# Altium integrated library Cap-Cer-SMD_V2.IntLib: 957 symbols (part 5 of 7)
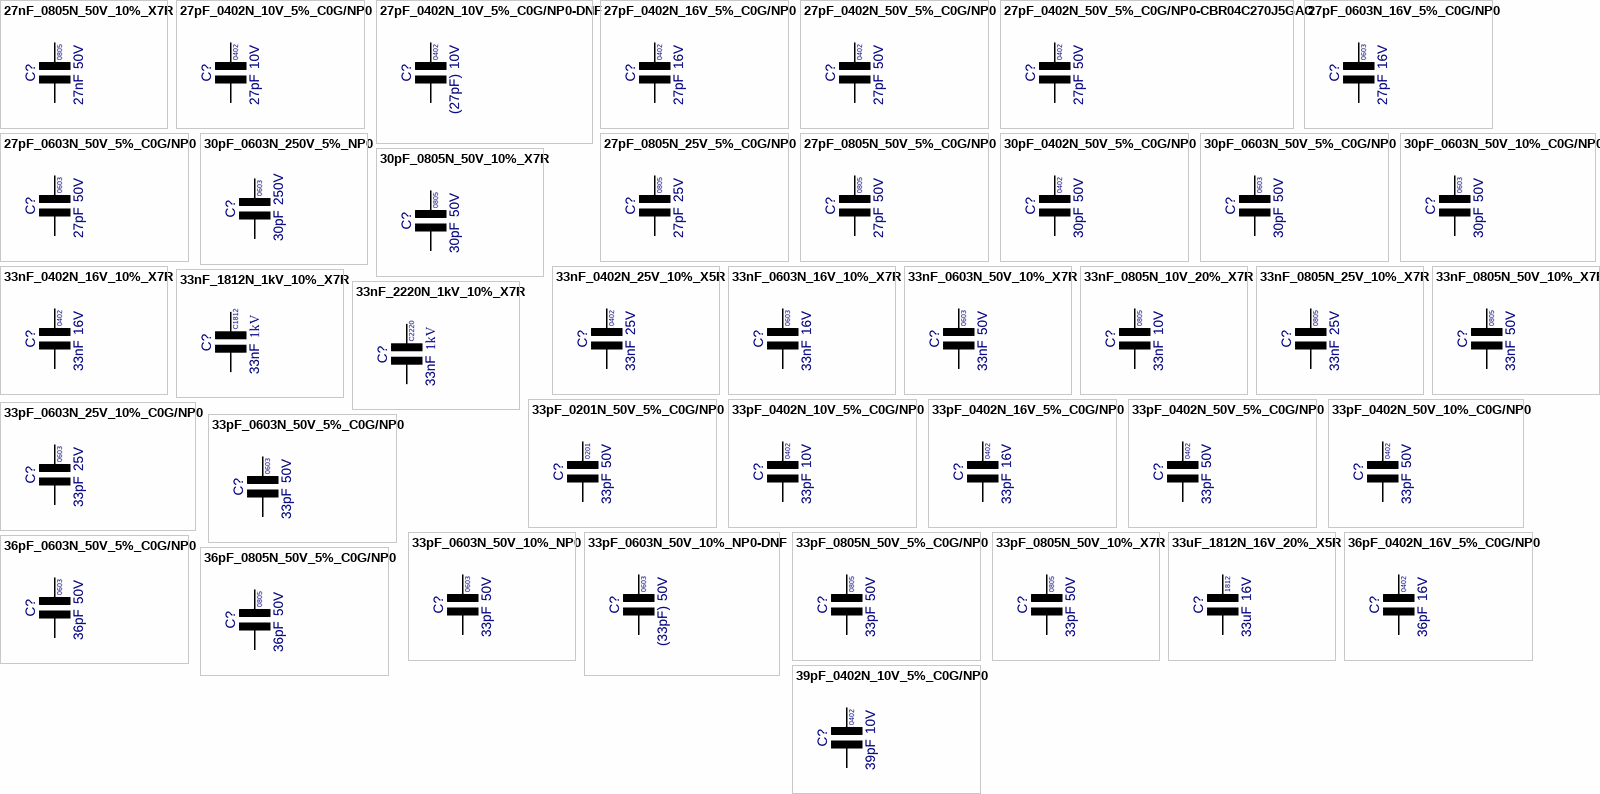
[diagram p27: symbols 27nF_0805N_50V_10%_X7R to 39pF_0402N_10V_5%_C0G/NP0]

## 33uF_1812N_16V_20%_X5R
designator C?, comment value 33uF  Voltage: 16V  Text1: 1812  (hidden comment: 33uF_C1812_16V_20%_X5R)
Cap Ceramic X5R; Manufacturer: Various; Part Number: 33uF 1812 16V 20% X5R; Tol: 20%; Package: CAPC1812X280N; EDM-PN: *; Text2: *; SAAB PN: *; DCE Part No: *
footprint CAPC1812X280N (Chip Capacitor, 1812, 2-Leads, Body 4.5x3.2mm, IPC Medium Density)
pins: 1, 2

## 36pF_0402N_16V_5%_C0G/NP0
designator C?, comment value 36pF  Voltage: 16V  Text1: 0402  (hidden comment: 36pF_C0402_16V_5%_C0G/NP0)
Cap Ceramic C0G/NP0; Manufacturer: Various; Part Number: 36pF 0402 16V 5% C0G/NP0; Tol: 5%; Package: CAPC0402X60N; EDM-PN: *; Text2: *; SAAB PN: *; DCE Part No: *
footprint CAPC0402X60N (Chip Capacitor, 0402, 2-Leads, Body 1.0x0.5mm, IPC Medium Density)
pins: 1, 2

## 36pF_0603N_50V_5%_C0G/NP0
designator C?, comment value 36pF  Voltage: 50V  Text1: 0603  (hidden comment: 36pF_C0603_50V_5%_C0G/NP0)
Cap Ceramic C0G/NP0; Manufacturer: Various; Part Number: 36pF 0603 50V 5% C0G/NP0; Tol: 5%; Package: CAPC0603X85N; EDM-PN: *; Text2: *; SAAB PN: *; DCE Part No: *
footprint CAPC0603X85N (Chip Capacitor, 0603, 2-Leads, Body 1.6x0.8mm, IPC Medium Density)
pins: 1, 2

## 36pF_0805N_50V_5%_C0G/NP0
designator C?, comment value 36pF  Voltage: 50V  Text1: 0805  (hidden comment: 36pF_C0805_50V_5%_C0G/NP0)
Cap Ceramic C0G/NP0; Manufacturer: Various; Part Number: 36pF 0805 50V 5% C0G/NP0; Tol: 5%; Package: CAPC0805X110N; EDM-PN: *; Text2: *; SAAB PN: *; DCE Part No: *
footprint CAPC0805X110N (Chip Capacitor, 0805, 2-Leads, Body 2.0x1.3mm, IPC Medium Density)
pins: 1, 2

## 39pF_0402N_10V_5%_C0G/NP0
designator C?, comment value 39pF  Voltage: 10V  Text1: 0402  (hidden comment: 39pF_C0402_10V_5%_C0G/NP0)
Cap Ceramic C0G/NP0; Manufacturer: Various; Part Number: 39pF 0402 10V 5% C0G/NP0; EDM-PN: CAP1274; Tol: 5%; Package: CAPC0402X60N; Text2: *; SAAB PN: *; DCE Part No: *
footprint CAPC0402X60N (Chip Capacitor, 0402, 2-Leads, Body 1.0x0.5mm, IPC Medium Density)
pins: 1, 2

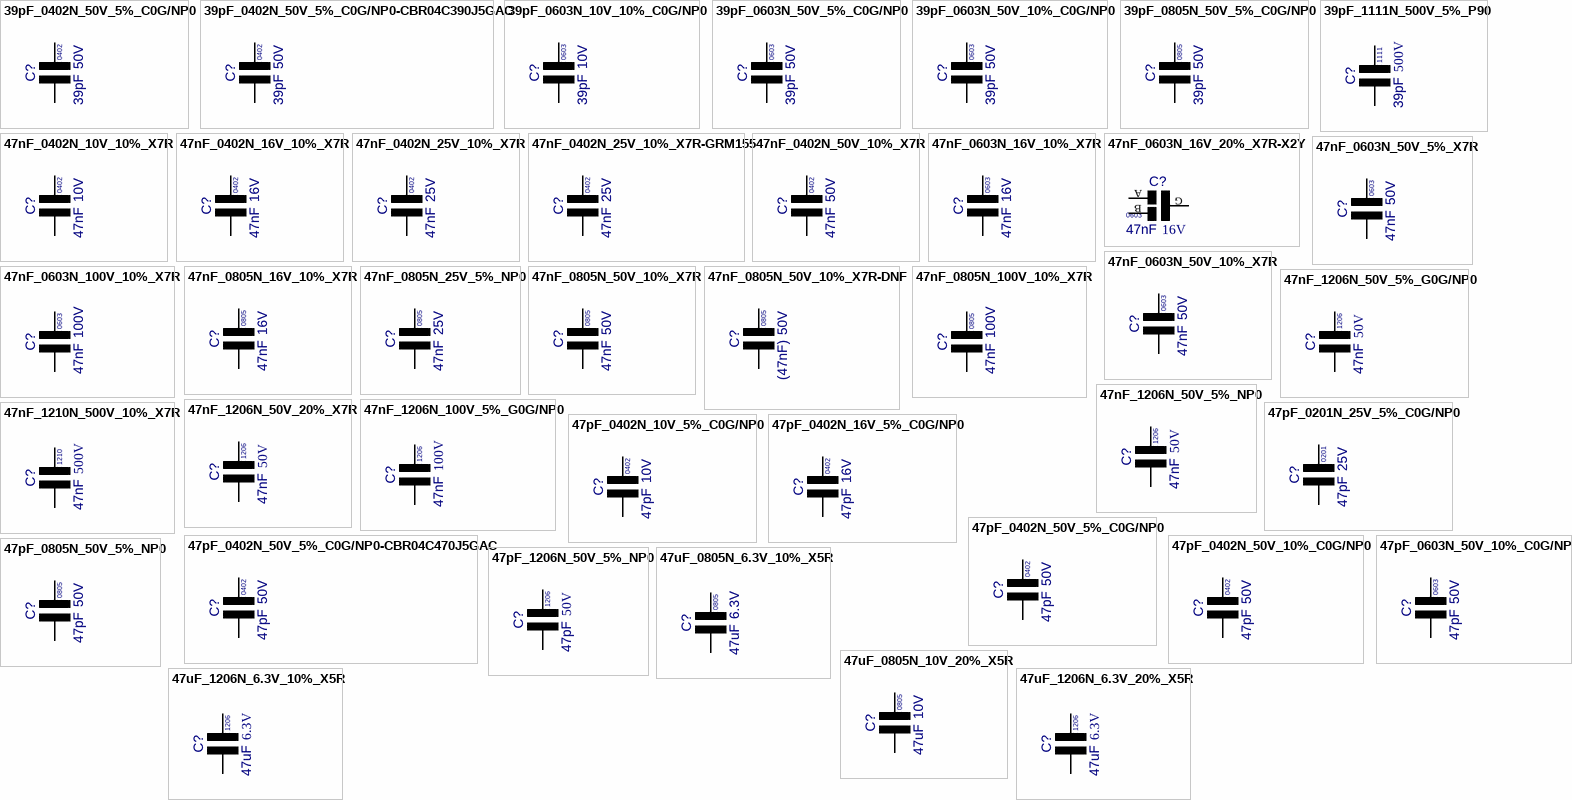
[diagram p15: symbols 39pF_0402N_50V_5%_C0G/NP0 to 47uF_1206N_6.3V_20%_X5R]

## 39pF_0402N_50V_5%_C0G/NP0
designator C?, comment value 39pF  Voltage: 50V  Text1: 0402  (hidden comment: 39pF_C0402_50V_5%_C0G)
Cap Ceramic C0G/NP0; Manufacturer: Various; Part Number: 39pF 0402 50V 5% C0G/NP0; EDM-PN: CAP1274; Tol: 5%; Package: CAPC0402X60N; Text2: *; SAAB PN: *; DCE Part No: *
footprint CAPC0402X60N (Chip Capacitor, 0402, 2-Leads, Body 1.0x0.5mm, IPC Medium Density)
pins: 1, 2

## 39pF_0402N_50V_5%_C0G/NP0-CBR04C390J5GAC
designator C?, comment value 39pF  Voltage: 50V  Text1: 0402  (hidden comment: CBR04C390J5GAC)
Cap Ceramic C0G/NP0 HiQ-CBR Series for RF; Manufacturer: Kemet; EDM-PN: CAP1405; Tol: 5%; Part Number: CBR04C390J5GAC; Package: CAPC0402X60N; Text2: *; SAAB PN: *; DCE Part No: *
footprint CAPC0402X60N (Chip Capacitor, 0402, 2-Leads, Body 1.0x0.5mm, IPC Medium Density)
pins: 1, 2

## 39pF_0603N_10V_10%_C0G/NP0
designator C?, comment value 39pF  Voltage: 10V  Text1: 0603  (hidden comment: 39pF_C0603_10V_10%_C0G/NP0)
Cap Ceramic C0G/NP0; Manufacturer: Various; Part Number: 39pF 0603 10V 10% C0G/NP0; Tol: 10%; Package: CAPC0603X85N; EDM-PN: *; Text2: *; SAAB PN: *; DCE Part No: *
footprint CAPC0603X85N (Chip Capacitor, 0603, 2-Leads, Body 1.6x0.8mm, IPC Medium Density)
pins: 1, 2

## 39pF_0603N_50V_5%_C0G/NP0
designator C?, comment value 39pF  Voltage: 50V  Text1: 0603  (hidden comment: 39pF_C0603_50V_5%_C0G/NP0)
Cap Ceramic C0G/NP0; Manufacturer: Various; Part Number: 39pF 0603 50V 5% C0G/NP0; EDM-PN: CAP436; Tol: 5%; Package: CAPC0603X85N; Text2: *; SAAB PN: *; DCE Part No: *
footprint CAPC0603X85N (Chip Capacitor, 0603, 2-Leads, Body 1.6x0.8mm, IPC Medium Density)
pins: 1, 2

## 39pF_0603N_50V_10%_C0G/NP0
designator C?, comment value 39pF  Voltage: 50V  Text1: 0603  (hidden comment: 39pF_C0603_50V_10%_C0G/NP0)
Cap Ceramic C0G/NP0; Manufacturer: Various; Part Number: 39pF 0603 50V 10% C0G/NP0; EDM-PN: CAP94; Tol: 10%; Package: CAPC0603X85N; Text2: *; SAAB PN: *; DCE Part No: *
footprint CAPC0603X85N (Chip Capacitor, 0603, 2-Leads, Body 1.6x0.8mm, IPC Medium Density)
pins: 1, 2

## 39pF_0805N_50V_5%_C0G/NP0
designator C?, comment value 39pF  Voltage: 50V  Text1: 0805  (hidden comment: 39pF_C0805_50V_5%_C0G/NP0)
Cap Ceramic C0G/NP0; Manufacturer: Various; Part Number: 39pF 0805 50V 5% C0G/NP0; Tol: 5%; Package: CAPC0805X110N; EDM-PN: *; Text2: *; SAAB PN: *; DCE Part No: *
footprint CAPC0805X110N (Chip Capacitor, 0805, 2-Leads, Body 2.0x1.3mm, IPC Medium Density)
pins: 1, 2

## 39pF_1111N_500V_5%_P90
designator C?, comment value 39pF  Voltage: 500V  Text1: 1111  (hidden comment: 100B390JT500XT)
Cap Ceramic P90; Manufacturer: ATC; Tol: 5%; Part Number: 100B390JT500XT; Package: CAPC1111-100B-T; EDM-PN: *; Text2: *; SAAB PN: *; DCE Part No: *
footprint CAPC1111-100B-T (Capacitor, 1111 2.79x2.79mm)
pins: 1, 2

## 47nF_0402N_10V_10%_X7R
designator C?, comment value 47nF  Voltage: 10V  Text1: 0402  (hidden comment: 47nF_C0402_10V_10%_X7R)
Cap Ceramic X7R; Manufacturer: Various; Part Number: 47nF 0402 10V 10% X7R; Tol: 10%; Package: CAPC0402X60N; EDM-PN: *; Text2: *; SAAB PN: *; DCE Part No: *
footprint CAPC0402X60N (Chip Capacitor, 0402, 2-Leads, Body 1.0x0.5mm, IPC Medium Density)
pins: 1, 2

## 47nF_0402N_16V_10%_X7R
designator C?, comment value 47nF  Voltage: 16V  Text1: 0402  (hidden comment: 47nF_C0402_16V_10%_X7R)
Cap Ceramic X7R; Manufacturer: Various; Part Number: 47nF 0402 16V 10% X7R; Tol: 10%; Package: CAPC0402X60N; EDM-PN: *; Text2: *; SAAB PN: *; DCE Part No: *
footprint CAPC0402X60N (Chip Capacitor, 0402, 2-Leads, Body 1.0x0.5mm, IPC Medium Density)
pins: 1, 2

## 47nF_0402N_25V_10%_X7R
designator C?, comment value 47nF  Voltage: 25V  Text1: 0402  (hidden comment: 47nF_C0402_25V_10%_X7R)
Cap Ceramic X7R; Manufacturer: Various; Part Number: 47nF 0402 25V 10% X7R; Tol: 10%; Package: CAPC0402X60N; EDM-PN: *; Text2: *; SAAB PN: *; DCE Part No: *
footprint CAPC0402X60N (Chip Capacitor, 0402, 2-Leads, Body 1.0x0.5mm, IPC Medium Density)
pins: 1, 2

## 47nF_0402N_25V_10%_X7R-GRM155
designator C?, comment value 47nF  Voltage: 25V  Text1: 0402  (hidden comment: 47nF_C0402_25V_10%_X7R)
Cap Ceramic X7R; Manufacturer: Murata; Part Number: GRM155R71E473KA; Tol: 10%; Package: GRM155-0.20; EDM-PN: *; Text2: *; SAAB PN: *; DCE Part No: *
footprint GRM155-0.20 (GRM155 0402 1.0x0.5mm)
pins: 1, 2

## 47nF_0402N_50V_10%_X7R
designator C?, comment value 47nF  Voltage: 50V  Text1: 0402  (hidden comment: 47nF_C0402_50V_10%_X7R)
Cap Ceramic X7R; Manufacturer: Various; Part Number: 47nF 0402 50V 10% X7R; EDM-PN: CAP878; Tol: 10%; Package: CAPC0402X60N; Text2: *; SAAB PN: *; DCE Part No: *
footprint CAPC0402X60N (Chip Capacitor, 0402, 2-Leads, Body 1.0x0.5mm, IPC Medium Density)
pins: 1, 2

## 47nF_0603N_16V_10%_X7R
designator C?, comment value 47nF  Voltage: 16V  Text1: 0603  (hidden comment: 47nF_C0603_16V_10%_X7R)
Cap Ceramic X7R; Manufacturer: Various; Part Number: 47nF 0603 16V 10% X7R; Tol: 10%; Reutech PN: 5910-CA-0546; Package: CAPC0603X85N; EDM-PN: *; Text2: *; SAAB PN: *; DCE Part No: *
footprint CAPC0603X85N (Chip Capacitor, 0603, 2-Leads, Body 1.6x0.8mm, IPC Medium Density)
pins: 1, 2

## 47nF_0603N_16V_20%_X7R-X2Y
designator C?, comment value 47nF  Voltage: 16V  Text1: 0603  (hidden comment: X2Y-47nF_C0603_16V_20%_X7R)
Cap Ceramic X2Y; Manufacturer: Johanson; Part Number: 160X14W473MV4T; Tol: 20%; Package: CAPC0603-X2Y; EDM-PN: *; Text2: *; SAAB PN: *; DCE Part No: *
footprint CAPC0603-X2Y (Cap 0603 X2Y 1.6x0.89mm)
pins: A, B, G

## 47nF_0603N_50V_5%_X7R
designator C?, comment value 47nF  Voltage: 50V  Text1: 0603  (hidden comment: 47nF_C0603_50V_5%_X7R)
Cap Ceramic X7R; Manufacturer: Various; Part Number: 47nF 0603 50V 5% X7R; Tol: 5%; Reutech PN: 5910-CA-0432; Package: CAPC0603X85N; EDM-PN: *; Text2: *; SAAB PN: *; DCE Part No: *
footprint CAPC0603X85N (Chip Capacitor, 0603, 2-Leads, Body 1.6x0.8mm, IPC Medium Density)
pins: 1, 2

## 47nF_0603N_50V_10%_X7R
designator C?, comment value 47nF  Voltage: 50V  Text1: 0603  (hidden comment: 47nF_C0603_50V_10%_X7R)
Cap Ceramic X7R; Manufacturer: Various; Part Number: 47nF 0603 50V 10% X7R; EDM-PN: CAP201; Tol: 10%; Package: CAPC0603X85N; Text2: *; SAAB PN: *; DCE Part No: *
footprint CAPC0603X85N (Chip Capacitor, 0603, 2-Leads, Body 1.6x0.8mm, IPC Medium Density)
pins: 1, 2

## 47nF_0603N_100V_10%_X7R
designator C?, comment value 47nF  Voltage: 100V  Text1: 0603  (hidden comment: 47nF_C0603_100V_10%_X7R)
Cap Ceramic X7R; Manufacturer: Various; Part Number: 47nF 0603 100V 10% X7R; Tol: 10%; Package: CAPC0603X85N; EDM-PN: *; Text2: *; SAAB PN: *; DCE Part No: *
footprint CAPC0603X85N (Chip Capacitor, 0603, 2-Leads, Body 1.6x0.8mm, IPC Medium Density)
pins: 1, 2

## 47nF_0805N_16V_10%_X7R
designator C?, comment value 47nF  Voltage: 16V  Text1: 0805  (hidden comment: 47nF_C0805_16V_10%_X7R)
Cap Ceramic X7R; Manufacturer: Various; Part Number: 47nF 0805 16V 10% X7R; Tol: 10%; Package: CAPC0805X110N; EDM-PN: *; Text2: *; SAAB PN: *; DCE Part No: *
footprint CAPC0805X110N (Chip Capacitor, 0805, 2-Leads, Body 2.0x1.3mm, IPC Medium Density)
pins: 1, 2

## 47nF_0805N_25V_5%_NP0
designator C?, comment value 47nF  Voltage: 25V  Text1: 0805  (hidden comment: 47nF_C0805_25V_5%_NP0)
Cap Ceramic NP0; Manufacturer: Various; Part Number: 47nF 0805 25V 5% NP0; Tol: 5%; Package: CAPC0805X110N; EDM-PN: *; Text2: *; SAAB PN: *; DCE Part No: *
footprint CAPC0805X110N (Chip Capacitor, 0805, 2-Leads, Body 2.0x1.3mm, IPC Medium Density)
pins: 1, 2

## 47nF_0805N_50V_10%_X7R
designator C?, comment value 47nF  Voltage: 50V  Text1: 0805  (hidden comment: 47nF_C0805_50V_10%_X7R)
Cap Ceramic X7R; Manufacturer: Various; Part Number: 47nF 0805 50V 10% X7R; EDM-PN: CAP190; Tol: 10%; Package: CAPC0805X110N; Text2: *; SAAB PN: *; DCE Part No: *
footprint CAPC0805X110N (Chip Capacitor, 0805, 2-Leads, Body 2.0x1.3mm, IPC Medium Density)
pins: 1, 2

## 47nF_0805N_50V_10%_X7R-DNF
designator C?, comment value (47nF)  Voltage: 50V  Text1: 0805  (hidden comment: 47nF_C0805_50V_10%_X7R-DNF)
Cap Ceramic X7R - Do not Fit; Manufacturer: Various; Part Number: DNF - 47nF 0805 50V 10% X7R; EDM-PN: CAP190; Tol: 10%; Package: CAPC0805X110N; Text2: *; SAAB PN: *; DCE Part No: *
footprint CAPC0805X110N (Chip Capacitor, 0805, 2-Leads, Body 2.0x1.3mm, IPC Medium Density)
pins: 1, 2

## 47nF_0805N_100V_10%_X7R
designator C?, comment value 47nF  Voltage: 100V  Text1: 0805  (hidden comment: 47nF_C0805_100V_10%_X7R)
Cap Ceramic X7R; Manufacturer: Various; Part Number: 47nF 0805 100V 10% X7R; Tol: 10%; Package: CAPC0805X110N; EDM-PN: *; Text2: *; SAAB PN: *; DCE Part No: *
footprint CAPC0805X110N (Chip Capacitor, 0805, 2-Leads, Body 2.0x1.3mm, IPC Medium Density)
pins: 1, 2

## 47nF_1206N_50V_5%_G0G/NP0
designator C?, comment value 47nF  Voltage: 50V  Text1: 1206  (hidden comment: 47nF_C1206_50V_5%_G0G/NP0)
Cap Ceramic G0G/NP0; Manufacturer: Various; Part Number: 47nF 1206 50V 5% G0G/NP0; Tol: 5%; Package: CAPC1206X135N; EDM-PN: *; Text2: *; SAAB PN: *; DCE Part No: *
footprint CAPC1206X135N (Chip Capacitor, 1206, 2-Leads, Body 3.2x1.6mm, IPC Medium Density)
pins: 1, 2

## 47nF_1206N_50V_5%_NP0
designator C?, comment value 47nF  Voltage: 50V  Text1: 1206  (hidden comment: 47nF_C1206_50V_5%_NP0)
Cap Ceramic NP0; Manufacturer: Various; Part Number: 47nF 1206 50V 5% C0G/NP0; Tol: 5%; Package: CAPC1206X135N; EDM-PN: *; Text2: *; SAAB PN: *; DCE Part No: *
footprint CAPC1206X135N (Chip Capacitor, 1206, 2-Leads, Body 3.2x1.6mm, IPC Medium Density)
pins: 1, 2

## 47nF_1206N_50V_20%_X7R
designator C?, comment value 47nF  Voltage: 50V  Text1: 1206  (hidden comment: 47nF_C1206_50V_20%_X7R)
Cap Ceramic X7R; Manufacturer: Various; Part Number: 47nF 1206 50V 20% X7R; Tol: 20%; Reutech PN: 5910-CA-0324; Package: CAPC1206X135N; EDM-PN: *; Text2: *; SAAB PN: *; DCE Part No: *
footprint CAPC1206X135N (Chip Capacitor, 1206, 2-Leads, Body 3.2x1.6mm, IPC Medium Density)
pins: 1, 2

## 47nF_1206N_100V_5%_G0G/NP0
designator C?, comment value 47nF  Voltage: 100V  Text1: 1206  (hidden comment: 47nF_C1206_100V_5%_G0G/NP0)
Cap Ceramic G0G/NP0; Manufacturer: Various; Part Number: 47nF 1206 100V 5% G0G/NP0; Tol: 5%; Package: CAPC1206X135N; EDM-PN: *; Text2: *; SAAB PN: *; DCE Part No: *
footprint CAPC1206X135N (Chip Capacitor, 1206, 2-Leads, Body 3.2x1.6mm, IPC Medium Density)
pins: 1, 2

## 47nF_1210N_500V_10%_X7R
designator C?, comment value 47nF  Voltage: 500V  Text1: 1210  (hidden comment: 4nuF_C1210_500V_10%_X7R)
Cap Ceramic X7R; Manufacturer: Various; Part Number: 47nF 1210 5000V 10% X7R; Tol: 10%; Package: CAPC1210X135N; EDM-PN: *; Text2: *; SAAB PN: *; DCE Part No: *
footprint CAPC1210X135N (Chip Capacitor, 1210, 2-Leads, Body 3.2x2.5mm, IPC Medium Density)
pins: 1, 2

## 47pF_0201N_25V_5%_C0G/NP0
designator C?, comment value 47pF  Voltage: 25V  Text1: 0201  (hidden comment: 47pF_C0201_25V_5%_C0G/NP0)
Cap Ceramic C0G/NP0; Manufacturer: Various; Part Number: 47pF 0201 25V 5% C0G/NP0; Tol: 5%; Package: CAPC0201X33N; EDM-PN: *; Text2: *; SAAB PN: *; DCE Part No: *
footprint CAPC0201X33N (Chip Capacitor, 0201, 2-Leads, Body 0.6x0.3mm, IPC Medium Density)
pins: 1, 2

## 47pF_0402N_10V_5%_C0G/NP0
designator C?, comment value 47pF  Voltage: 10V  Text1: 0402  (hidden comment: 47pF_C0402_10V_5%_C0G/NP0)
Cap Ceramic C0G/NP0; Manufacturer: Various; Part Number: 47pF 0402 10V 5% C0G/NP0; Tol: 5%; Package: CAPC0402X60N; EDM-PN: *; Text2: *; SAAB PN: *; DCE Part No: *
footprint CAPC0402X60N (Chip Capacitor, 0402, 2-Leads, Body 1.0x0.5mm, IPC Medium Density)
pins: 1, 2

## 47pF_0402N_16V_5%_C0G/NP0
designator C?, comment value 47pF  Voltage: 16V  Text1: 0402  (hidden comment: 47pF_C0402_16V_5%_C0G/NP0)
Cap Ceramic C0G/NP0; Manufacturer: Various; Part Number: 47pF 0402 16V 5% C0G/NP0; Tol: 5%; Package: CAPC0402X60N; EDM-PN: *; Text2: *; SAAB PN: *; DCE Part No: *
footprint CAPC0402X60N (Chip Capacitor, 0402, 2-Leads, Body 1.0x0.5mm, IPC Medium Density)
pins: 1, 2

## 47pF_0402N_50V_5%_C0G/NP0
designator C?, comment value 47pF  Voltage: 50V  Text1: 0402  (hidden comment: 47pF_C0402_50V_5%_C0G/NP0)
Cap Ceramic C0G/NP0; Manufacturer: Various; Part Number: 47pF 0402 50V 5% C0G/NP0; EDM-PN: CAP798; Tol: 5%; Package: CAPC0402X60N; Text2: *; SAAB PN: *; DCE Part No: *
footprint CAPC0402X60N (Chip Capacitor, 0402, 2-Leads, Body 1.0x0.5mm, IPC Medium Density)
pins: 1, 2

## 47pF_0402N_50V_5%_C0G/NP0-CBR04C470J5GAC
designator C?, comment value 47pF  Voltage: 50V  Text1: 0402  (hidden comment: CBR04C470J5GAC)
Cap Ceramic C0G/NP0 HiQ-CBR Series for RF; Manufacturer: Kemet; EDM-PN: CAP1403; Tol: 5%; Part Number: CBR04C470J5GAC; Package: CAPC0402X60N; Text2: *; SAAB PN: *; DCE Part No: *
footprint CAPC0402X60N (Chip Capacitor, 0402, 2-Leads, Body 1.0x0.5mm, IPC Medium Density)
pins: 1, 2

## 47pF_0402N_50V_10%_C0G/NP0
designator C?, comment value 47pF  Voltage: 50V  Text1: 0402  (hidden comment: 47pF_C0402_50V_10%_C0G/NP0)
Cap Ceramic C0G/NP0; Manufacturer: Various; Part Number: 47pF 0402 50V 10% C0G/NP0; DCE Part No: 7394; Tol: 10%; Package: CAPC0402X60N; EDM-PN: *; Text2: *; SAAB PN: *
footprint CAPC0402X60N (Chip Capacitor, 0402, 2-Leads, Body 1.0x0.5mm, IPC Medium Density)
pins: 1, 2

## 47pF_0603N_50V_10%_C0G/NP0
designator C?, comment value 47pF  Voltage: 50V  Text1: 0603  (hidden comment: 47pF_C0603_50V_10%_C0G/NP0)
Cap Ceramic C0G/NP0; Manufacturer: Various; Part Number: 47pF 0603 50V 10% C0G/NP0; Tol: 10%; Package: CAPC0603X85N; EDM-PN: *; Text2: *; SAAB PN: *; DCE Part No: *
footprint CAPC0603X85N (Chip Capacitor, 0603, 2-Leads, Body 1.6x0.8mm, IPC Medium Density)
pins: 1, 2

## 47pF_0805N_50V_5%_NP0
designator C?, comment value 47pF  Voltage: 50V  Text1: 0805  (hidden comment: 47pF_C0805_50V_5%_NP0)
Cap Ceramic NP0; Manufacturer: Various; Part Number: 47pF 0805 50V 5% NP0; Tol: 5%; Package: CAPC0805X110N; EDM-PN: *; Text2: *; SAAB PN: *; DCE Part No: *
footprint CAPC0805X110N (Chip Capacitor, 0805, 2-Leads, Body 2.0x1.3mm, IPC Medium Density)
pins: 1, 2

## 47pF_1206N_50V_5%_NP0
designator C?, comment value 47pF  Voltage: 50V  Text1: 1206  (hidden comment: 47pF_C1206_50V_5%_NP0)
Cap Ceramic NP0; Manufacturer: Various; Part Number: 47pF 1206 50V 5% NP0; Tol: 5%; Package: CAPC1206X135N; EDM-PN: *; Text2: *; SAAB PN: *; DCE Part No: *
footprint CAPC1206X135N (Chip Capacitor, 1206, 2-Leads, Body 3.2x1.6mm, IPC Medium Density)
pins: 1, 2

## 47uF_0805N_6.3V_10%_X5R
designator C?, comment value 47uF  Voltage: 6.3V  Text1: 0805  (hidden comment: 47uF_C0805_6.3V_10%_X5R)
Cap Ceramic X5R; Manufacturer: Various; Part Number: 47uF 0805 6.3V 10% X5R; Tol: 10%; Package: CAPC0805X110N; EDM-PN: *; Text2: *; SAAB PN: *; DCE Part No: *
footprint CAPC0805X110N (Chip Capacitor, 0805, 2-Leads, Body 2.0x1.3mm, IPC Medium Density)
pins: 1, 2

## 47uF_0805N_10V_20%_X5R
designator C?, comment value 47uF  Voltage: 10V  Text1: 0805  (hidden comment: 47uF_C0805_10V_20%_X5R)
Cap Ceramic X5R; Manufacturer: Various; Part Number: 47uF 0805 10V 20% X5R; EDM-PN: CAP1224; Tol: 20%; Package: CAPC0805X110N; Text2: *; SAAB PN: *; DCE Part No: *
footprint CAPC0805X110N (Chip Capacitor, 0805, 2-Leads, Body 2.0x1.3mm, IPC Medium Density)
pins: 1, 2

## 47uF_1206N_6.3V_10%_X5R
designator C?, comment value 47uF  Voltage: 6.3V  Text1: 1206  (hidden comment: 47uF_C1206_6.3V_10%_X5R)
Cap Ceramic X5R; Manufacturer: Various; Part Number: 47uF 1206 6.3V 10% X5R; Tol: 10%; Package: CAPC1206X135N; EDM-PN: *; Text2: *; SAAB PN: *; DCE Part No: *
footprint CAPC1206X135N (Chip Capacitor, 1206, 2-Leads, Body 3.2x1.6mm, IPC Medium Density)
pins: 1, 2

## 47uF_1206N_6.3V_20%_X5R
designator C?, comment value 47uF  Voltage: 6.3V  Text1: 1206  (hidden comment: 47uF_C1206_6.3V_20%_X5R)
Cap Ceramic X5R; Manufacturer: Various; Part Number: 47uF 1206 6.3V 20% X5R; Tol: 20%; Package: CAPC1206X135N; EDM-PN: *; Text2: *; SAAB PN: *; DCE Part No: *
footprint CAPC1206X135N (Chip Capacitor, 1206, 2-Leads, Body 3.2x1.6mm, IPC Medium Density)
pins: 1, 2

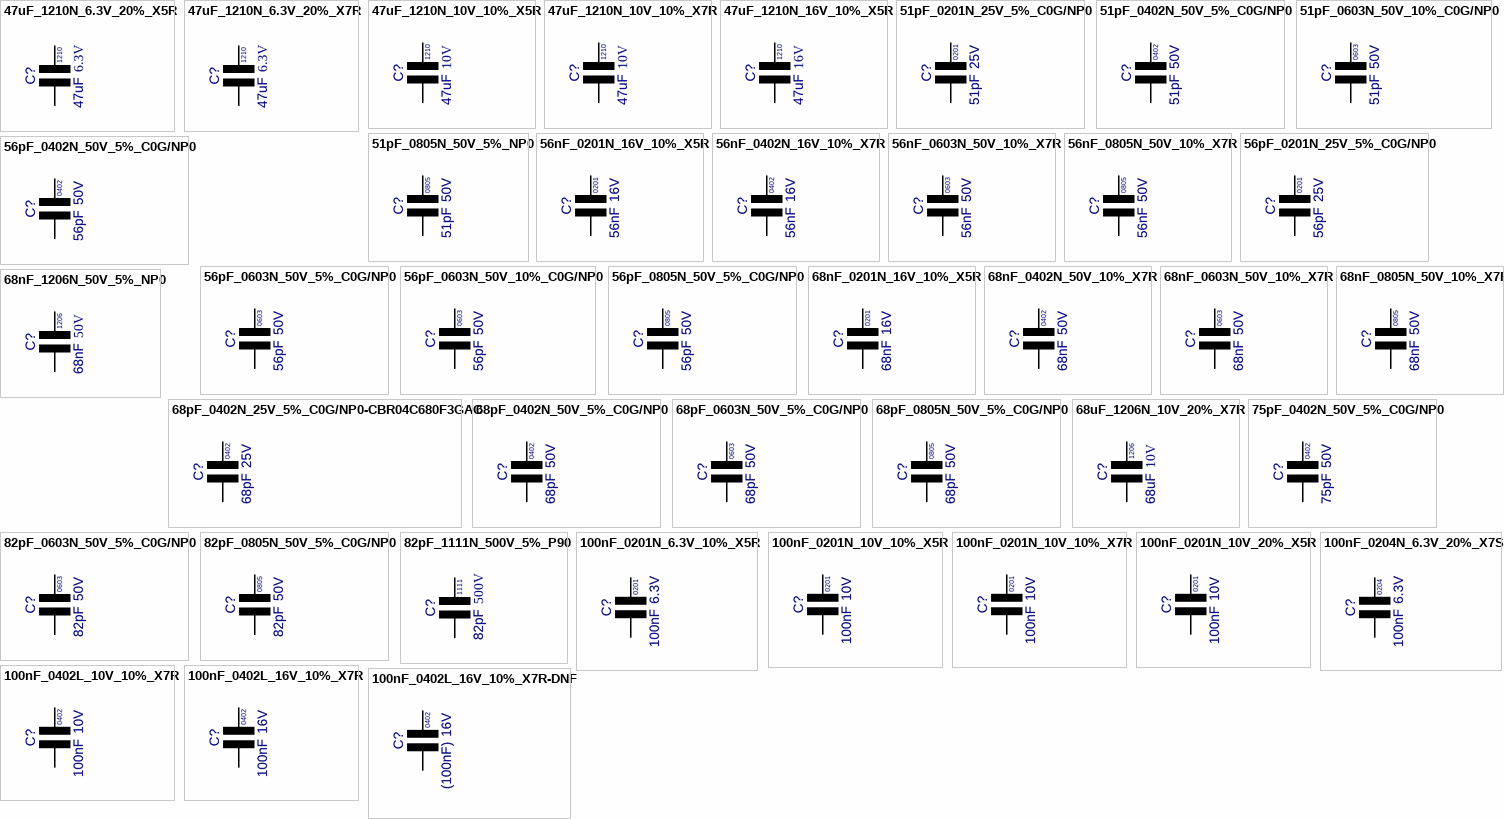
[diagram p16: symbols 47uF_1210N_6.3V_20%_X5R to 100nF_0402L_16V_10%_X7R-DNF]

## 47uF_1210N_6.3V_20%_X5R
designator C?, comment value 47uF  Voltage: 6.3V  Text1: 1210  (hidden comment: 47uF_C1210_6.3V_20%_X5R)
Cap Ceramic X5R; Manufacturer: Various; Part Number: 47uF 1210 6.3V 20% X5R; Tol: 20%; Package: CAPC1210X135N; EDM-PN: *; Text2: *; SAAB PN: *; DCE Part No: *
footprint CAPC1210X135N (Chip Capacitor, 1210, 2-Leads, Body 3.2x2.5mm, IPC Medium Density)
pins: 1, 2

## 47uF_1210N_6.3V_20%_X7R
designator C?, comment value 47uF  Voltage: 6.3V  Text1: 1210  (hidden comment: 47uF_C1210_6.3V_20%_X7R)
Cap Ceramic X7R; Manufacturer: Various; Part Number: 47uF 1210 6.3V 20% X7R; Tol: 20%; Package: CAPC1210X135N; EDM-PN: *; Text2: *; SAAB PN: *; DCE Part No: *
footprint CAPC1210X135N (Chip Capacitor, 1210, 2-Leads, Body 3.2x2.5mm, IPC Medium Density)
pins: 1, 2

## 47uF_1210N_10V_10%_X5R
designator C?, comment value 47uF  Voltage: 10V  Text1: 1210  (hidden comment: 47uF_C1210_10V_10%_X5R)
Cap Ceramic X5R; Manufacturer: Various; Part Number: 47uF 1210 10V 10% X5R; Tol: 10%; Package: CAPC1210X135N; EDM-PN: *; Text2: *; SAAB PN: *; DCE Part No: *
footprint CAPC1210X135N (Chip Capacitor, 1210, 2-Leads, Body 3.2x2.5mm, IPC Medium Density)
pins: 1, 2

## 47uF_1210N_10V_10%_X7R
designator C?, comment value 47uF  Voltage: 10V  Text1: 1210  (hidden comment: 47uF_C1210_10V_10%_X7R)
Cap Ceramic X7R; Manufacturer: Various; Part Number: 47uF 1210 10V 10% X7R; EDM-PN: CAP686; Tol: 10%; SAAB PN: 1AAB00435AEA; Package: CAPC1210X135N; Text2: *; DCE Part No: *
footprint CAPC1210X135N (Chip Capacitor, 1210, 2-Leads, Body 3.2x2.5mm, IPC Medium Density)
pins: 1, 2

## 47uF_1210N_16V_10%_X5R
designator C?, comment value 47uF  Voltage: 16V  Text1: 1210  (hidden comment: 47uF_C1210_16V_10%_X5R)
Cap Ceramic X5R; Manufacturer: Various; Part Number: 47uF 1210 16V 10% X5R; Tol: 10%; Package: CAPC1210X135N; EDM-PN: *; Text2: *; SAAB PN: *; DCE Part No: *
footprint CAPC1210X135N (Chip Capacitor, 1210, 2-Leads, Body 3.2x2.5mm, IPC Medium Density)
pins: 1, 2

## 51pF_0201N_25V_5%_C0G/NP0
designator C?, comment value 51pF  Voltage: 25V  Text1: 0201  (hidden comment: 51pF_C0201_25V_5%_C0G/NP0)
Cap Ceramic C0G/NP0; Manufacturer: Various; Part Number: 51pF 0201 25V 5% C0G/NP0; Tol: 5%; Package: CAPC0201X33N; EDM-PN: *; Text2: *; SAAB PN: *; DCE Part No: *
footprint CAPC0201X33N (Chip Capacitor, 0201, 2-Leads, Body 0.6x0.3mm, IPC Medium Density)
pins: 1, 2

## 51pF_0402N_50V_5%_C0G/NP0
designator C?, comment value 51pF  Voltage: 50V  Text1: 0402  (hidden comment: 51pF_C0402_50V_5%_C0G/NP0)
Cap Ceramic C0G/NP0; Manufacturer: Various; Part Number: 51pF 0402 50V 5% C0G/NP0; Tol: 5%; Package: CAPC0402X60N; EDM-PN: *; Text2: *; SAAB PN: *; DCE Part No: *
footprint CAPC0402X60N (Chip Capacitor, 0402, 2-Leads, Body 1.0x0.5mm, IPC Medium Density)
pins: 1, 2

## 51pF_0603N_50V_10%_C0G/NP0
designator C?, comment value 51pF  Voltage: 50V  Text1: 0603  (hidden comment: 51pF_C0603_50V_10%_C0G/NP0)
Cap Ceramic C0G/NP0; Manufacturer: Various; Part Number: 51pF 0603 50V 10% C0G/NP0; Tol: 10%; Package: CAPC0603X85N; EDM-PN: *; Text2: *; SAAB PN: *; DCE Part No: *
footprint CAPC0603X85N (Chip Capacitor, 0603, 2-Leads, Body 1.6x0.8mm, IPC Medium Density)
pins: 1, 2

## 51pF_0805N_50V_5%_NP0
designator C?, comment value 51pF  Voltage: 50V  Text1: 0805  (hidden comment: 51pF_C0805_50V_5%_NP0)
Cap Ceramic NP0; Manufacturer: Various; Part Number: 51pF 0805 50V 5% NP0; Tol: 5%; Package: CAPC0805X110N; EDM-PN: *; Text2: *; SAAB PN: *; DCE Part No: *
footprint CAPC0805X110N (Chip Capacitor, 0805, 2-Leads, Body 2.0x1.3mm, IPC Medium Density)
pins: 1, 2

## 56nF_0201N_16V_10%_X5R
designator C?, comment value 56nF  Voltage: 16V  Text1: 0201  (hidden comment: 56nF_C0201_16V_10%_X5R)
Cap Ceramic X5R; Manufacturer: Various; Part Number: 56nF 0201 16V 10% X5R; Tol: 10%; Package: CAPC0201X33N; EDM-PN: *; Text2: *; SAAB PN: *; DCE Part No: *
footprint CAPC0201X33N (Chip Capacitor, 0201, 2-Leads, Body 0.6x0.3mm, IPC Medium Density)
pins: 1, 2

## 56nF_0402N_16V_10%_X7R
designator C?, comment value 56nF  Voltage: 16V  Text1: 0402  (hidden comment: 56nF_C0402_16V_10%_X7R)
Cap Ceramic X7R; Manufacturer: Various; Part Number: 56nF 0402 16V 10% X7R; Tol: 10%; Package: CAPC0402X60N; EDM-PN: *; Text2: *; SAAB PN: *; DCE Part No: *
footprint CAPC0402X60N (Chip Capacitor, 0402, 2-Leads, Body 1.0x0.5mm, IPC Medium Density)
pins: 1, 2

## 56nF_0603N_50V_10%_X7R
designator C?, comment value 56nF  Voltage: 50V  Text1: 0603  (hidden comment: 56nF_C0603_50V_10%_X7R)
Cap Ceramic X7R; Manufacturer: Various; Part Number: 56nF 0603 50V 10% X7R; Tol: 10%; Package: CAPC0603X85N; EDM-PN: *; Text2: *; SAAB PN: *; DCE Part No: *
footprint CAPC0603X85N (Chip Capacitor, 0603, 2-Leads, Body 1.6x0.8mm, IPC Medium Density)
pins: 1, 2

## 56nF_0805N_50V_10%_X7R
designator C?, comment value 56nF  Voltage: 50V  Text1: 0805  (hidden comment: 56nF_C0805_50V_10%_X7R)
Cap Ceramic X7R; Manufacturer: Various; Part Number: 56nF 0805 50V 10% X7R; Tol: 10%; Package: CAPC0805X110N; EDM-PN: *; Text2: *; SAAB PN: *; DCE Part No: *
footprint CAPC0805X110N (Chip Capacitor, 0805, 2-Leads, Body 2.0x1.3mm, IPC Medium Density)
pins: 1, 2

## 56pF_0201N_25V_5%_C0G/NP0
designator C?, comment value 56pF  Voltage: 25V  Text1: 0201  (hidden comment: 56pF_C0201_25V_5%_C0G/NP0)
Cap Ceramic C0G/NP0; Manufacturer: Various; Part Number: 56pF 0201 25V 5% C0G/NP0; Tol: 5%; Package: CAPC0201X33N; EDM-PN: *; Text2: *; SAAB PN: *; DCE Part No: *
footprint CAPC0201X33N (Chip Capacitor, 0201, 2-Leads, Body 0.6x0.3mm, IPC Medium Density)
pins: 1, 2

## 56pF_0402N_50V_5%_C0G/NP0
designator C?, comment value 56pF  Voltage: 50V  Text1: 0402  (hidden comment: 56pF_C0402_50V_5%_C0G/NP0)
Cap Ceramic C0G/NP0; Manufacturer: Various; Part Number: 56pF 0402 50V 5% C0G/NP0; Tol: 5%; Package: CAPC0402X60N; EDM-PN: *; Text2: *; SAAB PN: *; DCE Part No: *
footprint CAPC0402X60N (Chip Capacitor, 0402, 2-Leads, Body 1.0x0.5mm, IPC Medium Density)
pins: 1, 2

## 56pF_0603N_50V_5%_C0G/NP0
designator C?, comment value 56pF  Voltage: 50V  Text1: 0603  (hidden comment: 56pF_C0603_50V_5%_C0G/NP0)
Cap Ceramic C0G/NP0; Manufacturer: Various; Part Number: 56pF 0603 50V 5% C0G/NP0; Tol: 5%; Package: CAPC0603X85N; EDM-PN: *; Text2: *; SAAB PN: *; DCE Part No: *
footprint CAPC0603X85N (Chip Capacitor, 0603, 2-Leads, Body 1.6x0.8mm, IPC Medium Density)
pins: 1, 2

## 56pF_0603N_50V_10%_C0G/NP0
designator C?, comment value 56pF  Voltage: 50V  Text1: 0603  (hidden comment: 56pF_C0603_50V_10%_C0G/NP0)
Cap Ceramic C0G/NP0; Manufacturer: Various; Part Number: 56pF 0603 50V 10% C0G/NP0; Tol: 10%; Package: CAPC0603X85N; EDM-PN: *; Text2: *; SAAB PN: *; DCE Part No: *
footprint CAPC0603X85N (Chip Capacitor, 0603, 2-Leads, Body 1.6x0.8mm, IPC Medium Density)
pins: 1, 2

## 56pF_0805N_50V_5%_C0G/NP0
designator C?, comment value 56pF  Voltage: 50V  Text1: 0805  (hidden comment: 56pF_C0805_50V_5%_C0G/NP0)
Cap Ceramic C0G/NP0; Manufacturer: Various; Part Number: 56pF 0805 50V 5% C0G/NP0; Tol: 5%; Package: CAPC0805X110N; EDM-PN: *; Text2: *; SAAB PN: *; DCE Part No: *
footprint CAPC0805X110N (Chip Capacitor, 0805, 2-Leads, Body 2.0x1.3mm, IPC Medium Density)
pins: 1, 2

## 68nF_0201N_16V_10%_X5R
designator C?, comment value 68nF  Voltage: 16V  Text1: 0201  (hidden comment: 68nF_C0201_16V_10%_X5R)
Cap Ceramic X5R; Manufacturer: Various; Part Number: 68nF 0201 16V 10% X5R; Tol: 10%; Package: CAPC0201X33N; EDM-PN: *; Text2: *; SAAB PN: *; DCE Part No: *
footprint CAPC0201X33N (Chip Capacitor, 0201, 2-Leads, Body 0.6x0.3mm, IPC Medium Density)
pins: 1, 2

## 68nF_0402N_50V_10%_X7R
designator C?, comment value 68nF  Voltage: 50V  Text1: 0402  (hidden comment: 68nF_C0402_50V_10%_X7R)
Cap Ceramic X7R; Manufacturer: Various; Part Number: 68nF 0402 50V 10% X7R; Tol: 10%; Package: CAPC0402X60N; EDM-PN: *; Text2: *; SAAB PN: *; DCE Part No: *
footprint CAPC0402X60N (Chip Capacitor, 0402, 2-Leads, Body 1.0x0.5mm, IPC Medium Density)
pins: 1, 2

## 68nF_0603N_50V_10%_X7R
designator C?, comment value 68nF  Voltage: 50V  Text1: 0603  (hidden comment: 68nF_C0603_50V_10%_X7R)
Cap Ceramic X7R; Manufacturer: Various; Part Number: 68nF 0603 50V 10% X7R; EDM-PN: CAP1348; Tol: 10%; Package: CAPC0603X85N; Text2: *; SAAB PN: *; DCE Part No: *
footprint CAPC0603X85N (Chip Capacitor, 0603, 2-Leads, Body 1.6x0.8mm, IPC Medium Density)
pins: 1, 2

## 68nF_0805N_50V_10%_X7R
designator C?, comment value 68nF  Voltage: 50V  Text1: 0805  (hidden comment: 68nF_C0805_50V_10%_X7R)
Cap Ceramic X7R; Manufacturer: Various; Part Number: 68nF 0805 50V 10% X7R; Tol: 10%; Package: CAPC0805X110N; EDM-PN: *; Text2: *; SAAB PN: *; DCE Part No: *
footprint CAPC0805X110N (Chip Capacitor, 0805, 2-Leads, Body 2.0x1.3mm, IPC Medium Density)
pins: 1, 2

## 68nF_1206N_50V_5%_NP0
designator C?, comment value 68nF  Voltage: 50V  Text1: 1206  (hidden comment: 68nF_C1206_50V_5%_NP0)
Cap Ceramic NP0; Manufacturer: Various; Part Number: 68nF 1206 50V 5% NP0; Tol: 5%; Package: CAPC1206X178N; EDM-PN: *; Text2: *; SAAB PN: *; DCE Part No: *
footprint CAPC1206X178N (Chip Capacitor, 1206, 2-Leads, Body 3.2x1.6mm, IPC Medium Density)
pins: 1, 2

## 68pF_0402N_25V_5%_C0G/NP0-CBR04C680F3GAC
designator C?, comment value 68pF  Voltage: 25V  Text1: 0402  (hidden comment: CBR04C680F3GAC)
Cap Ceramic C0G/NP0 HiQ-CBR Series for RF; Manufacturer: Kemet; EDM-PN: CAP1431; Tol: 1%; Part Number: CBR04C680F3GAC; Package: CAPC0402X60N; Text2: *; SAAB PN: *; DCE Part No: *
footprint CAPC0402X60N (Chip Capacitor, 0402, 2-Leads, Body 1.0x0.5mm, IPC Medium Density)
pins: 1, 2

## 68pF_0402N_50V_5%_C0G/NP0
designator C?, comment value 68pF  Voltage: 50V  Text1: 0402  (hidden comment: 68pF_C0402_50V_5%_C0G/NP0)
Cap Ceramic C0G/NP0; Manufacturer: Various; Part Number: 68pF 0402 50V 5% C0G/NP0; EDM-PN: CAP1428; Tol: 5%; Package: CAPC0402X60N; Text2: *; SAAB PN: *; DCE Part No: *
footprint CAPC0402X60N (Chip Capacitor, 0402, 2-Leads, Body 1.0x0.5mm, IPC Medium Density)
pins: 1, 2

## 68pF_0603N_50V_5%_C0G/NP0
designator C?, comment value 68pF  Voltage: 50V  Text1: 0603  (hidden comment: 68pF_C0603_50V_5%_C0G/NP0)
Cap Ceramic C0G/NP0; Manufacturer: Various; Part Number: 68pF 0603 50V 5% C0G/NP0; EDM-PN: CAP472; Tol: 5%; Package: CAPC0603X85N; Text2: *; SAAB PN: *; DCE Part No: *
footprint CAPC0603X85N (Chip Capacitor, 0603, 2-Leads, Body 1.6x0.8mm, IPC Medium Density)
pins: 1, 2

## 68pF_0805N_50V_5%_C0G/NP0
designator C?, comment value 68pF  Voltage: 50V  Text1: 0805  (hidden comment: 68pF_C0805_50V_5%_C0G/NP0)
Cap Ceramic C0G/NP0; Manufacturer: Various; Part Number: 68pF 0805 50V 5% C0G/NP0; Tol: 5%; Package: CAPC0805X110N; EDM-PN: *; Text2: *; SAAB PN: *; DCE Part No: *
footprint CAPC0805X110N (Chip Capacitor, 0805, 2-Leads, Body 2.0x1.3mm, IPC Medium Density)
pins: 1, 2
